# Altium footprint library PrintNC_GRBLHAL_Breakout.PcbLib: 51 footprints (part 2 of 5)
Each footprint in its own frame and in the unit in brackets; x right, y up, seen from the top. Pads: shape width x height; smd on the part's side, far side on the other; paste and mask are expansions set on the pad; w line width, h text height; cw(c..) or ccw(c..) is an arc to the next point about the centre after c.
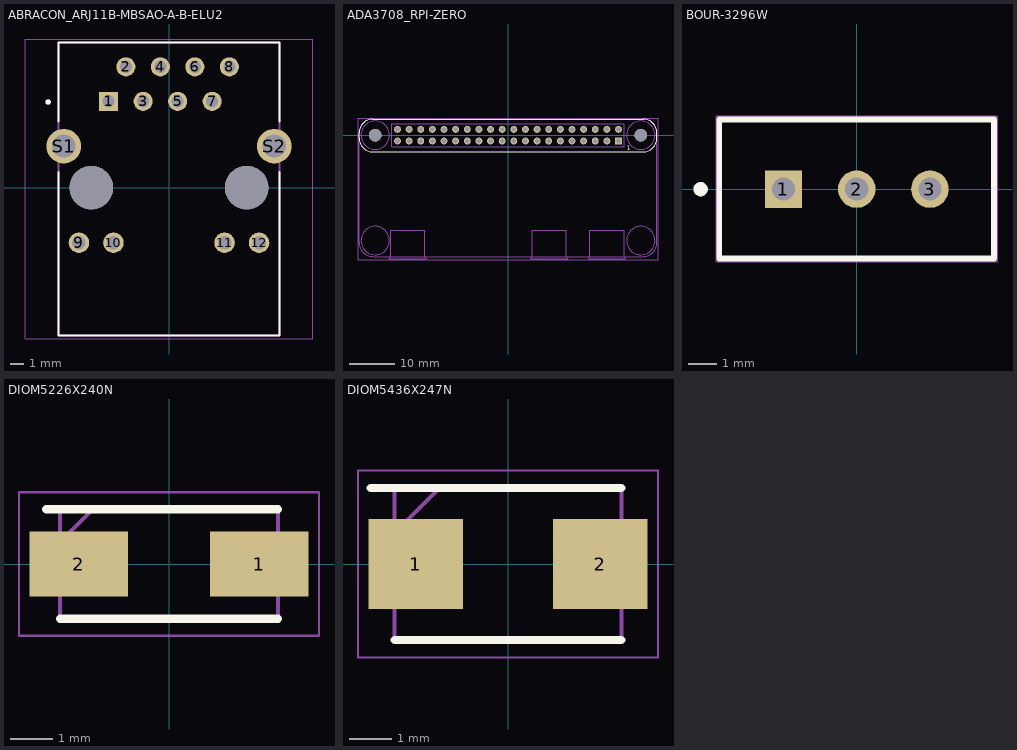
[diagram p1: the footprints below, top view; thin cyan lines are the x and y axes]

## ABRACON_ARJ11B-MBSAO-A-B-ELU2 [mm]
pads (16):
  rect 1.408x1.408 hole 0.9: 1(-4.445,6.35)
  round 1.408 hole 0.9: 2(-3.175,8.89) 3(-1.905,6.35) 4(-0.635,8.89) 5(0.635,6.35) 6(1.905,8.89) 7(3.175,6.35) 8(4.445,8.89)
  round 1.508 hole 1: 9(-6.63,-4.06) 10(-4.09,-4.06) 11(4.09,-4.06) 12(6.63,-4.06)
  round 2.55 hole 1.7: S1(-7.75,3.05) S2(7.75,3.05)
  round 3.2 hole 3.2 unplated: ""(-5.715,0) ""(5.715,0)
Top Overlay:
  circle w0.2: c-8.9,6.3 r0.1
  lines w0.127: -8.13,1.15 -8.13,-10.9 8.13,-10.9 8.13,1.15 ; -8.13,4.85 -8.13,10.69 8.13,10.69 8.13,4.85
Mechanical 13:
  circle w0.2: c-8.9,6.3 r0.1
  lines w0.127: -8.13,-10.9 -8.13,10.69 8.13,10.69 8.13,-10.9 -8.13,-10.9
Mechanical 15:
  lines w0.05: -10.575,-11.15 -10.575,10.94 10.575,10.94 10.575,-11.15 -10.575,-11.15
3D body "ARJ11B-MA.STEP": height 16.74, standoff -2.6, extent -10.453,-10.922 10.199,10.668

## ADA3708_RPI-ZERO [mm] "Mirrored connector mounting"
pads (42):
  rect 1.508x1.508 hole 1: 1(24.13,-1.27)
  round 1.508 hole 1: 2(24.13,1.27) 3(21.59,-1.27) 4(21.59,1.27) 5(19.05,-1.27) 6(19.05,1.27) 7(16.51,-1.27) 8(16.51,1.27) 9(13.97,-1.27) 10(13.97,1.27) 11(11.43,-1.27) 12(11.43,1.27) 13(8.89,-1.27) 14(8.89,1.27) 15(6.35,-1.27) 16(6.35,1.27) 17(3.81,-1.27) 18(3.81,1.27) 19(1.27,-1.27) 20(1.27,1.27) 21(-1.27,-1.27) 22(-1.27,1.27) 23(-3.81,-1.27) 24(-3.81,1.27) 25(-6.35,-1.27) 26(-6.35,1.27) 27(-8.89,-1.27) 28(-8.89,1.27) 29(-11.43,-1.27) 30(-11.43,1.27) 31(-13.97,-1.27) 32(-13.97,1.27) 33(-16.51,-1.27) 34(-16.51,1.27) 35(-19.05,-1.27) 36(-19.05,1.27) 37(-21.59,-1.27) 38(-21.59,1.27) 39(-24.13,-1.27) 40(-24.13,1.27)
  round 2.75 hole 2.75 unplated: ""(-29,0) ""(29,0)
Top Overlay:
  lines w0.127: -32.512,-0.635 ccw(c-29.512,-0.635) -29.512,-3.635 ; -32.5,-0.635 -32.5,0.5 cw(c-29.5,0.5) -29.5,3.5 29.5,3.5 cw(c29.5,0.5) 32.5,0.5 32.5,-0.635 ; -29.5,-3.64 29.5,-3.64 ; 29.512,-3.635 ccw(c29.512,-0.635) 32.512,-0.635
  text "1" at 25.908,-3.302 h1.02
Mechanical 13:
  circle w0.127: c-29,-23 r3.1
  circle w0.127: c29,-23 r3.1
  circle w0.127: c29,0 r3.1
  circle w0.127: c-29,0 r3.1
  lines w0.127: 4.4,-26.5 5.25,-26.5 ; 17,-26.5 17.85,-26.5 ; -25.65,-26.5 -29.5,-26.5 cw(c-29.5,-23.5) -32.5,-23.5 -32.5,0.5 cw(c-29.5,0.5) -29.5,3.5 29.5,3.5 cw(c29.5,0.5) 32.5,0.5 32.5,-23.5 cw(c29.5,-23.5) 29.5,-26.5 -18.15,-26.5 ; -25.65,-26.5 -18.15,-26.5 ; -25.65,-26.5 -25.65,-20.75 -18.15,-20.75 -18.15,-26.5 ; -25.65,-26.5 -25.9,-27 -17.9,-27 -18.15,-26.5 ; 5.25,-26.5 12.75,-26.5 ; 5.25,-26.5 5.25,-20.75 12.75,-20.75 12.75,-26.5 ; 5.25,-26.5 5,-27 13,-27 12.75,-26.5 ; 17.85,-26.5 25.35,-26.5 ; 17.85,-26.5 17.85,-20.75 25.35,-20.75 25.35,-26.5 ; 17.85,-26.5 17.6,-27 25.6,-27 25.35,-26.5 ; -25.4,-2.54 -25.4,2.54 25.4,2.54 25.4,-2.54 -25.4,-2.54
Mechanical 15:
  lines w0.05: -32.75,-27.25 32.75,-27.25 32.75,3.75 -32.75,3.75 -32.75,-27.25
3D body "ADA3708--3DModel-STEP-56544.STEP": height 11.18, standoff 0.26, extent -33.5,-27.557 32.5,3.443

## BOUR-3296W [mm] "THD, 3-Leads, Body 9.53x4.83mm, Pitch 2.54mm"
height 11.904
pads (3):
  rect 1.3x1.3 hole 0.8: 1(-2.54,0)
  round 1.3 hole 0.8: 2(0,0) 3(2.54,0)
Top Overlay:
  circle w0.25: c-5.415,0 r0.125
  lines w0.2: 4.765,-2.41 -4.765,-2.41 -4.765,2.42 4.765,2.42 4.765,-2.405
Mechanical 13:
  lines w0.1: -4.765,-2.41 -4.765,2.42 4.765,2.42 4.765,-2.41 -4.765,-2.41
Mechanical 15:
  lines w0.05: -4.865,-2.51 -4.865,2.52 4.865,2.52 4.865,-2.51 -4.865,-2.51
  lines w0.1: -0.5,0 0.5,0 ; 0,-0.5 0,0.5
3D body "3296W.stp": height 11.55, standoff -6.4, extent -4.762,-2.405 4.762,2.421

## DIOM5226X240N [mm]
pads (2):
  rect 2.35x1.55 smd: 1(2.15,0) 2(-2.15,0)
Top Overlay:
  lines w0.2: -2.925,1.302 2.598,1.302 ; -2.598,-1.302 2.598,-1.302
Mechanical 13:
  lines w0.1: -2.598,0.528 -1.822,1.302 ; -2.598,-1.302 2.598,-1.302 2.598,1.302 -2.598,1.302 -2.598,-1.302
Mechanical 15:
  lines w0.05: -3.575,-1.71 3.575,-1.71 3.575,1.71 -3.575,1.71 -3.575,-1.71
3D body "SMAZ27-13-F.stp": height 2.4, standoff 0, extent -2.598,-1.302 2.598,1.302

## DIOM5436X247N [mm]
pads (2):
  rect 2.25x2.15 smd: 1(-2.2,0) 2(2.2,0)
Top Overlay:
  lines w0.2: -3.275,1.812 2.702,1.812 ; -2.702,-1.812 2.702,-1.812
Mechanical 13:
  lines w0.1: -2.702,0.738 -1.628,1.812 ; -2.702,-1.812 -2.702,1.812 2.702,1.812 2.702,-1.812 -2.702,-1.812
Mechanical 15:
  lines w0.05: -3.575,-2.225 -3.575,2.225 3.575,2.225 3.575,-2.225 -3.575,-2.225
3D body "1SMB5935BT3G.stp": height 2.47, standoff 0, extent -2.702,-1.813 2.702,1.813